# Altium integrated library Weidmueller_OMNIMATE_Signal.IntLib: 2550 symbols (part 35 of 45) (continued)
## 1876930000_Single (continued)

## 1876940000
designator J?
OMNIMATE Signal - series BL/SL 5.08; PartNumber: 1876940000; Manufacturer: Weidmueller; Short_text_for_material: SL-SMT 5.08/04/270FH 1.5SN BK RL; Side_termination_characteristic: Solder flange; Mounting_onto_the_PCB: Reflow solder connection; Pitch_mm: 5.08 mm; Pitch_inch: 0.2 inch; No_of_poles: 4; Outgoing_elbow: 270°; Solder_pin_length_mm: 1.5 mm; Contact_surface: tinned; Insulating_material: LCP GF; UL_94_flammability_rating: V-0; Rated_voltage_for_surge_voltage_class_pollution_degree_II_2: 400 V; Rated_current_min_no_of_poles_TU_20_deg_C: 19 A; Rated_voltage_use_group_B_UL_1059: 300 V; Rated_current_use_group_B_UL_1059: 15 A; PackageReference: SL_SMT_5_08_270FH_04; Colour: Black; Packaging: Tape; Qty: 335 PCS; Revision: V1; ComponentLink1Description: Manufacturer URL; ComponentLink1URL: http://www.weidmueller.com/; ComponentLink2Description: URL Link1; ComponentLink2URL: http://catalog.weidmueller.com/catalog/Start.do?localeId=en&ObjectID=1876940000
footprint SL_SMT_5_08_270FH_04 (OMNIMATE Signal - Serie BL/SL 5.08  SL-SMT 5.08/04/270)
pins: A1, A2, A3, A4

## 1876940000_Single
designator J?
OMNIMATE Signal - series BL/SL 5.08; PartNumber: 1876940000; Manufacturer: Weidmueller; Short_text_for_material: SL-SMT 5.08/04/270FH 1.5SN BK RL; Side_termination_characteristic: Solder flange; Mounting_onto_the_PCB: Reflow solder connection; Pitch_mm: 5.08 mm; Pitch_inch: 0.2 inch; No_of_poles: 4; Outgoing_elbow: 270°; Solder_pin_length_mm: 1.5 mm; Contact_surface: tinned; Insulating_material: LCP GF; UL_94_flammability_rating: V-0; Rated_voltage_for_surge_voltage_class_pollution_degree_II_2: 400 V; Rated_current_min_no_of_poles_TU_20_deg_C: 19 A; Rated_voltage_use_group_B_UL_1059: 300 V; Rated_current_use_group_B_UL_1059: 15 A; PackageReference: SL_SMT_5_08_270FH_04; Colour: Black; Packaging: Tape; Qty: 335 PCS; Revision: V1; ComponentLink1Description: Manufacturer URL; ComponentLink1URL: http://www.weidmueller.com/; ComponentLink2Description: URL Link1; ComponentLink2URL: http://catalog.weidmueller.com/catalog/Start.do?localeId=en&ObjectID=1876940000
footprint SL_SMT_5_08_270FH_04 (OMNIMATE Signal - Serie BL/SL 5.08  SL-SMT 5.08/04/270)
part A pins: A1
part B pins: A2
part C pins: A3
part D pins: A4

## 1876980000
designator J?
OMNIMATE Signal - series BL/SL 5.08; PartNumber: 1876980000; Manufacturer: Weidmueller; Short_text_for_material: SL-SMT 5.08/08/270FH 1.5SN BK RL; Side_termination_characteristic: Solder flange; Mounting_onto_the_PCB: Reflow solder connection; Pitch_mm: 5.08 mm; Pitch_inch: 0.2 inch; No_of_poles: 8; Outgoing_elbow: 270°; Solder_pin_length_mm: 1.5 mm; Contact_surface: tinned; Insulating_material: LCP GF; UL_94_flammability_rating: V-0; Rated_voltage_for_surge_voltage_class_pollution_degree_II_2: 400 V; Rated_current_min_no_of_poles_TU_20_deg_C: 19 A; Rated_voltage_use_group_B_UL_1059: 300 V; Rated_current_use_group_B_UL_1059: 15 A; PackageReference: SL_SMT_5_08_270FH_08; Colour: Black; Packaging: Tape; Qty: 285 PCS; Revision: V1; ComponentLink1Description: Manufacturer URL; ComponentLink1URL: http://www.weidmueller.com/; ComponentLink2Description: URL Link1; ComponentLink2URL: http://catalog.weidmueller.com/catalog/Start.do?localeId=en&ObjectID=1876980000
footprint SL_SMT_5_08_270FH_08 (OMNIMATE Signal - Serie BL/SL 5.08  SL-SMT 5.08/08/270)
pins: A1, A2, A3, A4, A5, A6, A7, A8

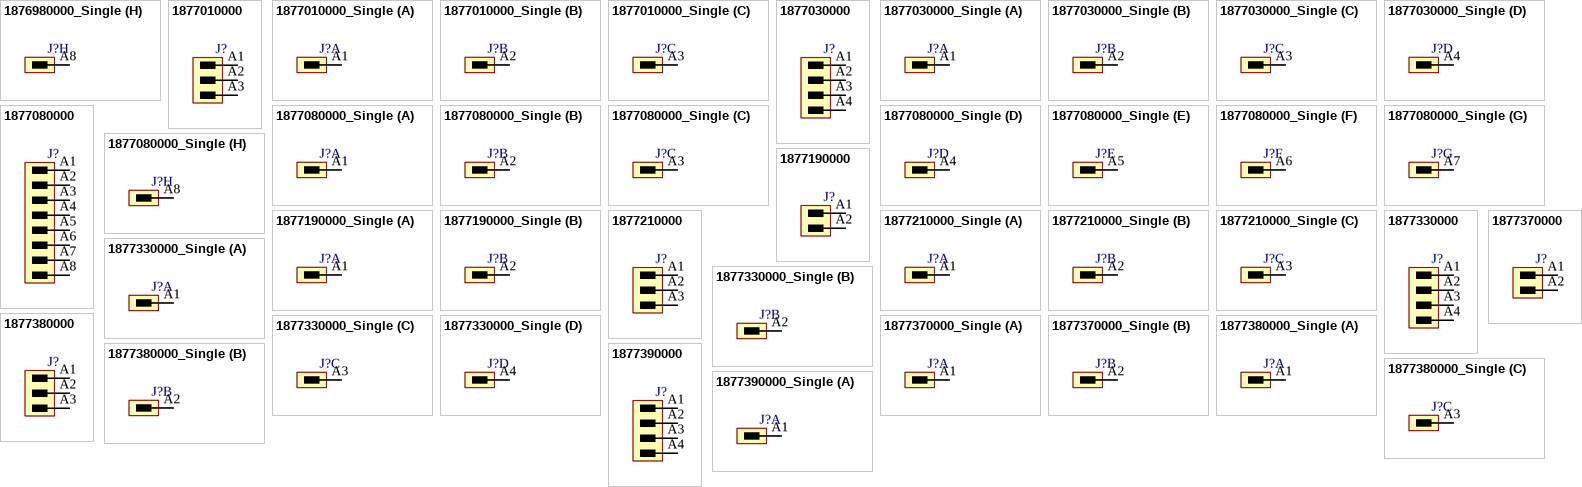
[diagram p167: symbols 1876980000_Single to 1877390000_Single]

## 1876980000_Single
designator J?
OMNIMATE Signal - series BL/SL 5.08; PartNumber: 1876980000; Manufacturer: Weidmueller; Short_text_for_material: SL-SMT 5.08/08/270FH 1.5SN BK RL; Side_termination_characteristic: Solder flange; Mounting_onto_the_PCB: Reflow solder connection; Pitch_mm: 5.08 mm; Pitch_inch: 0.2 inch; No_of_poles: 8; Outgoing_elbow: 270°; Solder_pin_length_mm: 1.5 mm; Contact_surface: tinned; Insulating_material: LCP GF; UL_94_flammability_rating: V-0; Rated_voltage_for_surge_voltage_class_pollution_degree_II_2: 400 V; Rated_current_min_no_of_poles_TU_20_deg_C: 19 A; Rated_voltage_use_group_B_UL_1059: 300 V; Rated_current_use_group_B_UL_1059: 15 A; PackageReference: SL_SMT_5_08_270FH_08; Colour: Black; Packaging: Tape; Qty: 285 PCS; Revision: V1; ComponentLink1Description: Manufacturer URL; ComponentLink1URL: http://www.weidmueller.com/; ComponentLink2Description: URL Link1; ComponentLink2URL: http://catalog.weidmueller.com/catalog/Start.do?localeId=en&ObjectID=1876980000
footprint SL_SMT_5_08_270FH_08 (OMNIMATE Signal - Serie BL/SL 5.08  SL-SMT 5.08/08/270)
part A pins: A1
part B pins: A2
part C pins: A3
part D pins: A4
part E pins: A5
part F pins: A6
part G pins: A7
part H pins: A8

## 1877010000
designator J?
OMNIMATE Signal - series BL/SL 5.08; PartNumber: 1877010000; Manufacturer: Weidmueller; Short_text_for_material: SL-SMT 5.08/03/270GH 1.5SN BK BX; Side_termination_characteristic: closed side; Mounting_onto_the_PCB: Reflow solder connection; Pitch_mm: 5.08 mm; Pitch_inch: 0.2 inch; No_of_poles: 3; Outgoing_elbow: 270°; Solder_pin_length_mm: 1.5 mm; Contact_surface: tinned; Insulating_material: LCP GF; UL_94_flammability_rating: V-0; Rated_voltage_for_surge_voltage_class_pollution_degree_II_2: 400 V; Rated_current_min_no_of_poles_TU_20_deg_C: 19 A; Rated_voltage_use_group_B_UL_1059: 300 V; Rated_current_use_group_B_UL_1059: 15 A; PackageReference: SL_SMT_5_08_270GH_03; Colour: Black; Packaging: Box; Qty: 100 PCS; Revision: V1; ComponentLink1Description: Manufacturer URL; ComponentLink1URL: http://www.weidmueller.com/; ComponentLink2Description: URL Link1; ComponentLink2URL: http://catalog.weidmueller.com/catalog/Start.do?localeId=en&ObjectID=1877010000
footprint SL_SMT_5_08_270GH_03 (OMNIMATE Signal - Serie BL/SL 5.08  SL-SMT 5.08/03/270GH 3.2)
pins: A1, A2, A3

## 1877010000_Single
designator J?
OMNIMATE Signal - series BL/SL 5.08; PartNumber: 1877010000; Manufacturer: Weidmueller; Short_text_for_material: SL-SMT 5.08/03/270GH 1.5SN BK BX; Side_termination_characteristic: closed side; Mounting_onto_the_PCB: Reflow solder connection; Pitch_mm: 5.08 mm; Pitch_inch: 0.2 inch; No_of_poles: 3; Outgoing_elbow: 270°; Solder_pin_length_mm: 1.5 mm; Contact_surface: tinned; Insulating_material: LCP GF; UL_94_flammability_rating: V-0; Rated_voltage_for_surge_voltage_class_pollution_degree_II_2: 400 V; Rated_current_min_no_of_poles_TU_20_deg_C: 19 A; Rated_voltage_use_group_B_UL_1059: 300 V; Rated_current_use_group_B_UL_1059: 15 A; PackageReference: SL_SMT_5_08_270GH_03; Colour: Black; Packaging: Box; Qty: 100 PCS; Revision: V1; ComponentLink1Description: Manufacturer URL; ComponentLink1URL: http://www.weidmueller.com/; ComponentLink2Description: URL Link1; ComponentLink2URL: http://catalog.weidmueller.com/catalog/Start.do?localeId=en&ObjectID=1877010000
footprint SL_SMT_5_08_270GH_03 (OMNIMATE Signal - Serie BL/SL 5.08  SL-SMT 5.08/03/270GH 3.2)
part A pins: A1
part B pins: A2
part C pins: A3

## 1877030000
designator J?
OMNIMATE Signal - series BL/SL 5.08; PartNumber: 1877030000; Manufacturer: Weidmueller; Short_text_for_material: SL-SMT 5.08/04/270GH 1.5SN BK BX; Side_termination_characteristic: closed side; Mounting_onto_the_PCB: Reflow solder connection; Pitch_mm: 5.08 mm; Pitch_inch: 0.2 inch; No_of_poles: 4; Outgoing_elbow: 270°; Solder_pin_length_mm: 1.5 mm; Contact_surface: tinned; Insulating_material: LCP GF; UL_94_flammability_rating: V-0; Rated_voltage_for_surge_voltage_class_pollution_degree_II_2: 400 V; Rated_current_min_no_of_poles_TU_20_deg_C: 19 A; Rated_voltage_use_group_B_UL_1059: 300 V; Rated_current_use_group_B_UL_1059: 15 A; PackageReference: SL_SMT_5_08_270GH_04; Colour: Black; Packaging: Box; Qty: 100 PCS; Revision: V1; ComponentLink1Description: Manufacturer URL; ComponentLink1URL: http://www.weidmueller.com/; ComponentLink2Description: URL Link1; ComponentLink2URL: http://catalog.weidmueller.com/catalog/Start.do?localeId=en&ObjectID=1877030000
footprint SL_SMT_5_08_270GH_04 (OMNIMATE Signal - Serie BL/SL 5.08  SL-SMT 5.08/04/270GH 3.2)
pins: A1, A2, A3, A4

## 1877030000_Single
designator J?
OMNIMATE Signal - series BL/SL 5.08; PartNumber: 1877030000; Manufacturer: Weidmueller; Short_text_for_material: SL-SMT 5.08/04/270GH 1.5SN BK BX; Side_termination_characteristic: closed side; Mounting_onto_the_PCB: Reflow solder connection; Pitch_mm: 5.08 mm; Pitch_inch: 0.2 inch; No_of_poles: 4; Outgoing_elbow: 270°; Solder_pin_length_mm: 1.5 mm; Contact_surface: tinned; Insulating_material: LCP GF; UL_94_flammability_rating: V-0; Rated_voltage_for_surge_voltage_class_pollution_degree_II_2: 400 V; Rated_current_min_no_of_poles_TU_20_deg_C: 19 A; Rated_voltage_use_group_B_UL_1059: 300 V; Rated_current_use_group_B_UL_1059: 15 A; PackageReference: SL_SMT_5_08_270GH_04; Colour: Black; Packaging: Box; Qty: 100 PCS; Revision: V1; ComponentLink1Description: Manufacturer URL; ComponentLink1URL: http://www.weidmueller.com/; ComponentLink2Description: URL Link1; ComponentLink2URL: http://catalog.weidmueller.com/catalog/Start.do?localeId=en&ObjectID=1877030000
footprint SL_SMT_5_08_270GH_04 (OMNIMATE Signal - Serie BL/SL 5.08  SL-SMT 5.08/04/270GH 3.2)
part A pins: A1
part B pins: A2
part C pins: A3
part D pins: A4

## 1877080000
designator J?
OMNIMATE Signal - series BL/SL 5.08; PartNumber: 1877080000; Manufacturer: Weidmueller; Short_text_for_material: SL-SMT 5.08/08/270GH 1.5SN BK BX; Side_termination_characteristic: closed side; Mounting_onto_the_PCB: Reflow solder connection; Pitch_mm: 5.08 mm; Pitch_inch: 0.2 inch; No_of_poles: 8; Outgoing_elbow: 270°; Solder_pin_length_mm: 1.5 mm; Contact_surface: tinned; Insulating_material: LCP GF; UL_94_flammability_rating: V-0; Rated_voltage_for_surge_voltage_class_pollution_degree_II_2: 400 V; Rated_current_min_no_of_poles_TU_20_deg_C: 19 A; Rated_voltage_use_group_B_UL_1059: 300 V; Rated_current_use_group_B_UL_1059: 15 A; PackageReference: SL_SMT_5_08_270GH_08; Colour: Black; Packaging: Box; Qty: 50 PCS; Revision: V1; ComponentLink1Description: Manufacturer URL; ComponentLink1URL: http://www.weidmueller.com/; ComponentLink2Description: URL Link1; ComponentLink2URL: http://catalog.weidmueller.com/catalog/Start.do?localeId=en&ObjectID=1877080000
footprint SL_SMT_5_08_270GH_08 (OMNIMATE Signal - Serie BL/SL 5.08  SL-SMT 5.08/08/270GH 3.2)
pins: A1, A2, A3, A4, A5, A6, A7, A8

## 1877080000_Single
designator J?
OMNIMATE Signal - series BL/SL 5.08; PartNumber: 1877080000; Manufacturer: Weidmueller; Short_text_for_material: SL-SMT 5.08/08/270GH 1.5SN BK BX; Side_termination_characteristic: closed side; Mounting_onto_the_PCB: Reflow solder connection; Pitch_mm: 5.08 mm; Pitch_inch: 0.2 inch; No_of_poles: 8; Outgoing_elbow: 270°; Solder_pin_length_mm: 1.5 mm; Contact_surface: tinned; Insulating_material: LCP GF; UL_94_flammability_rating: V-0; Rated_voltage_for_surge_voltage_class_pollution_degree_II_2: 400 V; Rated_current_min_no_of_poles_TU_20_deg_C: 19 A; Rated_voltage_use_group_B_UL_1059: 300 V; Rated_current_use_group_B_UL_1059: 15 A; PackageReference: SL_SMT_5_08_270GH_08; Colour: Black; Packaging: Box; Qty: 50 PCS; Revision: V1; ComponentLink1Description: Manufacturer URL; ComponentLink1URL: http://www.weidmueller.com/; ComponentLink2Description: URL Link1; ComponentLink2URL: http://catalog.weidmueller.com/catalog/Start.do?localeId=en&ObjectID=1877080000
footprint SL_SMT_5_08_270GH_08 (OMNIMATE Signal - Serie BL/SL 5.08  SL-SMT 5.08/08/270GH 3.2)
part A pins: A1
part B pins: A2
part C pins: A3
part D pins: A4
part E pins: A5
part F pins: A6
part G pins: A7
part H pins: A8

## 1877190000
designator J?
OMNIMATE Signal - series BL/SL 5.08; PartNumber: 1877190000; Manufacturer: Weidmueller; Short_text_for_material: SL-SMT 5.08/02/270FH 3.2SN BK BX; Side_termination_characteristic: Solder flange; Mounting_onto_the_PCB: Reflow solder connection; Pitch_mm: 5.08 mm; Pitch_inch: 0.2 inch; No_of_poles: 2; Outgoing_elbow: 270°; Solder_pin_length_mm: 3.2 mm; Contact_material: CuSn; Contact_surface: tinned; Insulating_material: LCP GF; UL_94_flammability_rating: V-0; Rated_voltage_for_surge_voltage_class_pollution_degree_II_2: 400 V; Rated_current_min_no_of_poles_TU_20_deg_C: 19 A; Rated_voltage_use_group_B_UL_1059: 300 V; Rated_current_use_group_B_UL_1059: 15 A; PackageReference: SL_SMT_5_08_270FH_02; Colour: Black; Packaging: Box; Qty: 100 PCS; Revision: V1; ComponentLink1Description: Manufacturer URL; ComponentLink1URL: http://www.weidmueller.com/; ComponentLink2Description: URL Link1; ComponentLink2URL: http://catalog.weidmueller.com/catalog/Start.do?localeId=en&ObjectID=1877190000
footprint SL_SMT_5_08_270FH_02 (OMNIMATE Signal - Serie BL/SL 5.08  SL-SMT 5.08/02/270)
pins: A1, A2

## 1877190000_Single
designator J?
OMNIMATE Signal - series BL/SL 5.08; PartNumber: 1877190000; Manufacturer: Weidmueller; Short_text_for_material: SL-SMT 5.08/02/270FH 3.2SN BK BX; Side_termination_characteristic: Solder flange; Mounting_onto_the_PCB: Reflow solder connection; Pitch_mm: 5.08 mm; Pitch_inch: 0.2 inch; No_of_poles: 2; Outgoing_elbow: 270°; Solder_pin_length_mm: 3.2 mm; Contact_material: CuSn; Contact_surface: tinned; Insulating_material: LCP GF; UL_94_flammability_rating: V-0; Rated_voltage_for_surge_voltage_class_pollution_degree_II_2: 400 V; Rated_current_min_no_of_poles_TU_20_deg_C: 19 A; Rated_voltage_use_group_B_UL_1059: 300 V; Rated_current_use_group_B_UL_1059: 15 A; PackageReference: SL_SMT_5_08_270FH_02; Colour: Black; Packaging: Box; Qty: 100 PCS; Revision: V1; ComponentLink1Description: Manufacturer URL; ComponentLink1URL: http://www.weidmueller.com/; ComponentLink2Description: URL Link1; ComponentLink2URL: http://catalog.weidmueller.com/catalog/Start.do?localeId=en&ObjectID=1877190000
footprint SL_SMT_5_08_270FH_02 (OMNIMATE Signal - Serie BL/SL 5.08  SL-SMT 5.08/02/270)
part A pins: A1
part B pins: A2

## 1877210000
designator J?
OMNIMATE Signal - series BL/SL 5.08; PartNumber: 1877210000; Manufacturer: Weidmueller; Short_text_for_material: SL-SMT 5.08/03/270FH 3.2SN BK BX; Side_termination_characteristic: Solder flange; Mounting_onto_the_PCB: Reflow solder connection; Pitch_mm: 5.08 mm; Pitch_inch: 0.2 inch; No_of_poles: 3; Outgoing_elbow: 270°; Solder_pin_length_mm: 3.2 mm; Contact_material: CuSn; Contact_surface: tinned; Insulating_material: LCP GF; UL_94_flammability_rating: V-0; Rated_voltage_for_surge_voltage_class_pollution_degree_II_2: 400 V; Rated_current_min_no_of_poles_TU_20_deg_C: 19 A; Rated_voltage_use_group_B_UL_1059: 300 V; Rated_current_use_group_B_UL_1059: 15 A; PackageReference: SL_SMT_5_08_270FH_03; Colour: Black; Packaging: Box; Qty: 100 PCS; Revision: V1; ComponentLink1Description: Manufacturer URL; ComponentLink1URL: http://www.weidmueller.com/; ComponentLink2Description: URL Link1; ComponentLink2URL: http://catalog.weidmueller.com/catalog/Start.do?localeId=en&ObjectID=1877210000
footprint SL_SMT_5_08_270FH_03 (OMNIMATE Signal - Serie BL/SL 5.08  SL-SMT 5.08/03/270)
pins: A1, A2, A3

## 1877210000_Single
designator J?
OMNIMATE Signal - series BL/SL 5.08; PartNumber: 1877210000; Manufacturer: Weidmueller; Short_text_for_material: SL-SMT 5.08/03/270FH 3.2SN BK BX; Side_termination_characteristic: Solder flange; Mounting_onto_the_PCB: Reflow solder connection; Pitch_mm: 5.08 mm; Pitch_inch: 0.2 inch; No_of_poles: 3; Outgoing_elbow: 270°; Solder_pin_length_mm: 3.2 mm; Contact_material: CuSn; Contact_surface: tinned; Insulating_material: LCP GF; UL_94_flammability_rating: V-0; Rated_voltage_for_surge_voltage_class_pollution_degree_II_2: 400 V; Rated_current_min_no_of_poles_TU_20_deg_C: 19 A; Rated_voltage_use_group_B_UL_1059: 300 V; Rated_current_use_group_B_UL_1059: 15 A; PackageReference: SL_SMT_5_08_270FH_03; Colour: Black; Packaging: Box; Qty: 100 PCS; Revision: V1; ComponentLink1Description: Manufacturer URL; ComponentLink1URL: http://www.weidmueller.com/; ComponentLink2Description: URL Link1; ComponentLink2URL: http://catalog.weidmueller.com/catalog/Start.do?localeId=en&ObjectID=1877210000
footprint SL_SMT_5_08_270FH_03 (OMNIMATE Signal - Serie BL/SL 5.08  SL-SMT 5.08/03/270)
part A pins: A1
part B pins: A2
part C pins: A3

## 1877330000
designator J?
OMNIMATE Signal - series BL/SL 5.08; PartNumber: 1877330000; Manufacturer: Weidmueller; Short_text_for_material: SL-SMT 5.08/04/270FH 3.2SN BK BX; Side_termination_characteristic: Solder flange; Mounting_onto_the_PCB: Reflow solder connection; Pitch_mm: 5.08 mm; Pitch_inch: 0.2 inch; No_of_poles: 4; Outgoing_elbow: 270°; Solder_pin_length_mm: 3.2 mm; Contact_material: CuSn; Contact_surface: tinned; Insulating_material: LCP GF; UL_94_flammability_rating: V-0; Rated_voltage_for_surge_voltage_class_pollution_degree_II_2: 400 V; Rated_current_min_no_of_poles_TU_20_deg_C: 19 A; Rated_voltage_use_group_B_UL_1059: 300 V; Rated_current_use_group_B_UL_1059: 15 A; PackageReference: SL_SMT_5_08_270FH_04; Colour: Black; Packaging: Box; Qty: 100 PCS; Revision: V1; ComponentLink1Description: Manufacturer URL; ComponentLink1URL: http://www.weidmueller.com/; ComponentLink2Description: URL Link1; ComponentLink2URL: http://catalog.weidmueller.com/catalog/Start.do?localeId=en&ObjectID=1877330000
footprint SL_SMT_5_08_270FH_04 (OMNIMATE Signal - Serie BL/SL 5.08  SL-SMT 5.08/04/270)
pins: A1, A2, A3, A4

## 1877330000_Single
designator J?
OMNIMATE Signal - series BL/SL 5.08; PartNumber: 1877330000; Manufacturer: Weidmueller; Short_text_for_material: SL-SMT 5.08/04/270FH 3.2SN BK BX; Side_termination_characteristic: Solder flange; Mounting_onto_the_PCB: Reflow solder connection; Pitch_mm: 5.08 mm; Pitch_inch: 0.2 inch; No_of_poles: 4; Outgoing_elbow: 270°; Solder_pin_length_mm: 3.2 mm; Contact_material: CuSn; Contact_surface: tinned; Insulating_material: LCP GF; UL_94_flammability_rating: V-0; Rated_voltage_for_surge_voltage_class_pollution_degree_II_2: 400 V; Rated_current_min_no_of_poles_TU_20_deg_C: 19 A; Rated_voltage_use_group_B_UL_1059: 300 V; Rated_current_use_group_B_UL_1059: 15 A; PackageReference: SL_SMT_5_08_270FH_04; Colour: Black; Packaging: Box; Qty: 100 PCS; Revision: V1; ComponentLink1Description: Manufacturer URL; ComponentLink1URL: http://www.weidmueller.com/; ComponentLink2Description: URL Link1; ComponentLink2URL: http://catalog.weidmueller.com/catalog/Start.do?localeId=en&ObjectID=1877330000
footprint SL_SMT_5_08_270FH_04 (OMNIMATE Signal - Serie BL/SL 5.08  SL-SMT 5.08/04/270)
part A pins: A1
part B pins: A2
part C pins: A3
part D pins: A4

## 1877370000
designator J?
OMNIMATE Signal - series BL/SL 5.08; PartNumber: 1877370000; Manufacturer: Weidmueller; Short_text_for_material: SL-SMT 5.08/02/270GH 3.2SN BK BX; Side_termination_characteristic: closed side; Mounting_onto_the_PCB: Reflow solder connection; Pitch_mm: 5.08 mm; Pitch_inch: 0.2 inch; No_of_poles: 2; Outgoing_elbow: 270°; Solder_pin_length_mm: 3.2 mm; Contact_material: CuSn; Contact_surface: tinned; Insulating_material: LCP GF; UL_94_flammability_rating: V-0; Rated_voltage_for_surge_voltage_class_pollution_degree_II_2: 400 V; Rated_current_min_no_of_poles_TU_20_deg_C: 19 A; Rated_voltage_use_group_B_UL_1059: 300 V; Rated_current_use_group_B_UL_1059: 15 A; PackageReference: SL_SMT_5_08_270GH_02; Colour: Black; Packaging: Box; Qty: 100 PCS; Revision: V1; ComponentLink1Description: Manufacturer URL; ComponentLink1URL: http://www.weidmueller.com/; ComponentLink2Description: URL Link1; ComponentLink2URL: http://catalog.weidmueller.com/catalog/Start.do?localeId=en&ObjectID=1877370000
footprint SL_SMT_5_08_270GH_02 (OMNIMATE Signal - Serie BL/SL 5.08  SL-SMT 5.08/02/270GH 3.2)
pins: A1, A2

## 1877370000_Single
designator J?
OMNIMATE Signal - series BL/SL 5.08; PartNumber: 1877370000; Manufacturer: Weidmueller; Short_text_for_material: SL-SMT 5.08/02/270GH 3.2SN BK BX; Side_termination_characteristic: closed side; Mounting_onto_the_PCB: Reflow solder connection; Pitch_mm: 5.08 mm; Pitch_inch: 0.2 inch; No_of_poles: 2; Outgoing_elbow: 270°; Solder_pin_length_mm: 3.2 mm; Contact_material: CuSn; Contact_surface: tinned; Insulating_material: LCP GF; UL_94_flammability_rating: V-0; Rated_voltage_for_surge_voltage_class_pollution_degree_II_2: 400 V; Rated_current_min_no_of_poles_TU_20_deg_C: 19 A; Rated_voltage_use_group_B_UL_1059: 300 V; Rated_current_use_group_B_UL_1059: 15 A; PackageReference: SL_SMT_5_08_270GH_02; Colour: Black; Packaging: Box; Qty: 100 PCS; Revision: V1; ComponentLink1Description: Manufacturer URL; ComponentLink1URL: http://www.weidmueller.com/; ComponentLink2Description: URL Link1; ComponentLink2URL: http://catalog.weidmueller.com/catalog/Start.do?localeId=en&ObjectID=1877370000
footprint SL_SMT_5_08_270GH_02 (OMNIMATE Signal - Serie BL/SL 5.08  SL-SMT 5.08/02/270GH 3.2)
part A pins: A1
part B pins: A2

## 1877380000
designator J?
OMNIMATE Signal - series BL/SL 5.08; PartNumber: 1877380000; Manufacturer: Weidmueller; Short_text_for_material: SL-SMT 5.08/03/270GH 3.2SN BK BX; Side_termination_characteristic: closed side; Mounting_onto_the_PCB: Reflow solder connection; Pitch_mm: 5.08 mm; Pitch_inch: 0.2 inch; No_of_poles: 3; Outgoing_elbow: 270°; Solder_pin_length_mm: 3.2 mm; Contact_material: CuSn; Contact_surface: tinned; Insulating_material: LCP GF; UL_94_flammability_rating: V-0; Rated_voltage_for_surge_voltage_class_pollution_degree_II_2: 400 V; Rated_current_min_no_of_poles_TU_20_deg_C: 19 A; Rated_voltage_use_group_B_UL_1059: 300 V; Rated_current_use_group_B_UL_1059: 15 A; PackageReference: SL_SMT_5_08_270GH_03; Colour: Black; Packaging: Box; Qty: 100 PCS; Revision: V1; ComponentLink1Description: Manufacturer URL; ComponentLink1URL: http://www.weidmueller.com/; ComponentLink2Description: URL Link1; ComponentLink2URL: http://catalog.weidmueller.com/catalog/Start.do?localeId=en&ObjectID=1877380000
footprint SL_SMT_5_08_270GH_03 (OMNIMATE Signal - Serie BL/SL 5.08  SL-SMT 5.08/03/270GH 3.2)
pins: A1, A2, A3

## 1877380000_Single
designator J?
OMNIMATE Signal - series BL/SL 5.08; PartNumber: 1877380000; Manufacturer: Weidmueller; Short_text_for_material: SL-SMT 5.08/03/270GH 3.2SN BK BX; Side_termination_characteristic: closed side; Mounting_onto_the_PCB: Reflow solder connection; Pitch_mm: 5.08 mm; Pitch_inch: 0.2 inch; No_of_poles: 3; Outgoing_elbow: 270°; Solder_pin_length_mm: 3.2 mm; Contact_material: CuSn; Contact_surface: tinned; Insulating_material: LCP GF; UL_94_flammability_rating: V-0; Rated_voltage_for_surge_voltage_class_pollution_degree_II_2: 400 V; Rated_current_min_no_of_poles_TU_20_deg_C: 19 A; Rated_voltage_use_group_B_UL_1059: 300 V; Rated_current_use_group_B_UL_1059: 15 A; PackageReference: SL_SMT_5_08_270GH_03; Colour: Black; Packaging: Box; Qty: 100 PCS; Revision: V1; ComponentLink1Description: Manufacturer URL; ComponentLink1URL: http://www.weidmueller.com/; ComponentLink2Description: URL Link1; ComponentLink2URL: http://catalog.weidmueller.com/catalog/Start.do?localeId=en&ObjectID=1877380000
footprint SL_SMT_5_08_270GH_03 (OMNIMATE Signal - Serie BL/SL 5.08  SL-SMT 5.08/03/270GH 3.2)
part A pins: A1
part B pins: A2
part C pins: A3

## 1877390000
designator J?
OMNIMATE Signal - series BL/SL 5.08; PartNumber: 1877390000; Manufacturer: Weidmueller; Short_text_for_material: SL-SMT 5.08/04/270GH 3.2SN BK BX; Side_termination_characteristic: closed side; Mounting_onto_the_PCB: Reflow solder connection; Pitch_mm: 5.08 mm; Pitch_inch: 0.2 inch; No_of_poles: 4; Outgoing_elbow: 270°; Solder_pin_length_mm: 3.2 mm; Contact_material: CuSn; Contact_surface: tinned; Insulating_material: LCP GF; UL_94_flammability_rating: V-0; Rated_voltage_for_surge_voltage_class_pollution_degree_II_2: 400 V; Rated_current_min_no_of_poles_TU_20_deg_C: 19 A; Rated_voltage_use_group_B_UL_1059: 300 V; Rated_current_use_group_B_UL_1059: 15 A; PackageReference: SL_SMT_5_08_270GH_04; Colour: Black; Packaging: Box; Qty: 100 PCS; Revision: V1; ComponentLink1Description: Manufacturer URL; ComponentLink1URL: http://www.weidmueller.com/; ComponentLink2Description: URL Link1; ComponentLink2URL: http://catalog.weidmueller.com/catalog/Start.do?localeId=en&ObjectID=1877390000
footprint SL_SMT_5_08_270GH_04 (OMNIMATE Signal - Serie BL/SL 5.08  SL-SMT 5.08/04/270GH 3.2)
pins: A1, A2, A3, A4

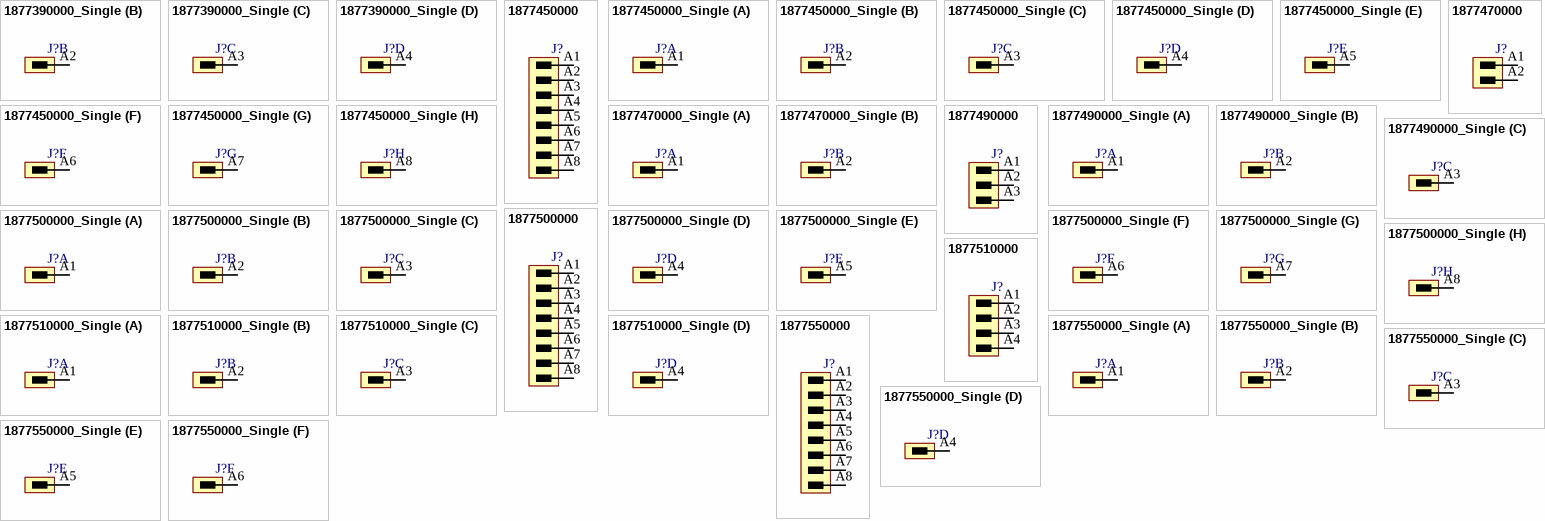
[diagram p168: symbols 1877390000_Single to 1877550000_Single]

## 1877390000_Single
designator J?
OMNIMATE Signal - series BL/SL 5.08; PartNumber: 1877390000; Manufacturer: Weidmueller; Short_text_for_material: SL-SMT 5.08/04/270GH 3.2SN BK BX; Side_termination_characteristic: closed side; Mounting_onto_the_PCB: Reflow solder connection; Pitch_mm: 5.08 mm; Pitch_inch: 0.2 inch; No_of_poles: 4; Outgoing_elbow: 270°; Solder_pin_length_mm: 3.2 mm; Contact_material: CuSn; Contact_surface: tinned; Insulating_material: LCP GF; UL_94_flammability_rating: V-0; Rated_voltage_for_surge_voltage_class_pollution_degree_II_2: 400 V; Rated_current_min_no_of_poles_TU_20_deg_C: 19 A; Rated_voltage_use_group_B_UL_1059: 300 V; Rated_current_use_group_B_UL_1059: 15 A; PackageReference: SL_SMT_5_08_270GH_04; Colour: Black; Packaging: Box; Qty: 100 PCS; Revision: V1; ComponentLink1Description: Manufacturer URL; ComponentLink1URL: http://www.weidmueller.com/; ComponentLink2Description: URL Link1; ComponentLink2URL: http://catalog.weidmueller.com/catalog/Start.do?localeId=en&ObjectID=1877390000
footprint SL_SMT_5_08_270GH_04 (OMNIMATE Signal - Serie BL/SL 5.08  SL-SMT 5.08/04/270GH 3.2)
part A pins: A1
part B pins: A2
part C pins: A3
part D pins: A4

## 1877450000
designator J?
OMNIMATE Signal - series BL/SL 5.08; PartNumber: 1877450000; Manufacturer: Weidmueller; Short_text_for_material: SL-SMT 5.08/08/270GH 3.2SN BK BX; Side_termination_characteristic: closed side; Mounting_onto_the_PCB: Reflow solder connection; Pitch_mm: 5.08 mm; Pitch_inch: 0.2 inch; No_of_poles: 8; Outgoing_elbow: 270°; Solder_pin_length_mm: 3.2 mm; Contact_material: CuSn; Contact_surface: tinned; Insulating_material: LCP GF; UL_94_flammability_rating: V-0; Rated_voltage_for_surge_voltage_class_pollution_degree_II_2: 400 V; Rated_current_min_no_of_poles_TU_20_deg_C: 19 A; Rated_voltage_use_group_B_UL_1059: 300 V; Rated_current_use_group_B_UL_1059: 15 A; PackageReference: SL_SMT_5_08_270GH_08; Colour: Black; Packaging: Box; Qty: 50 PCS; Revision: V1; ComponentLink1Description: Manufacturer URL; ComponentLink1URL: http://www.weidmueller.com/; ComponentLink2Description: URL Link1; ComponentLink2URL: http://catalog.weidmueller.com/catalog/Start.do?localeId=en&ObjectID=1877450000
footprint SL_SMT_5_08_270GH_08 (OMNIMATE Signal - Serie BL/SL 5.08  SL-SMT 5.08/08/270GH 3.2)
pins: A1, A2, A3, A4, A5, A6, A7, A8

## 1877450000_Single
designator J?
OMNIMATE Signal - series BL/SL 5.08; PartNumber: 1877450000; Manufacturer: Weidmueller; Short_text_for_material: SL-SMT 5.08/08/270GH 3.2SN BK BX; Side_termination_characteristic: closed side; Mounting_onto_the_PCB: Reflow solder connection; Pitch_mm: 5.08 mm; Pitch_inch: 0.2 inch; No_of_poles: 8; Outgoing_elbow: 270°; Solder_pin_length_mm: 3.2 mm; Contact_material: CuSn; Contact_surface: tinned; Insulating_material: LCP GF; UL_94_flammability_rating: V-0; Rated_voltage_for_surge_voltage_class_pollution_degree_II_2: 400 V; Rated_current_min_no_of_poles_TU_20_deg_C: 19 A; Rated_voltage_use_group_B_UL_1059: 300 V; Rated_current_use_group_B_UL_1059: 15 A; PackageReference: SL_SMT_5_08_270GH_08; Colour: Black; Packaging: Box; Qty: 50 PCS; Revision: V1; ComponentLink1Description: Manufacturer URL; ComponentLink1URL: http://www.weidmueller.com/; ComponentLink2Description: URL Link1; ComponentLink2URL: http://catalog.weidmueller.com/catalog/Start.do?localeId=en&ObjectID=1877450000
footprint SL_SMT_5_08_270GH_08 (OMNIMATE Signal - Serie BL/SL 5.08  SL-SMT 5.08/08/270GH 3.2)
part A pins: A1
part B pins: A2
part C pins: A3
part D pins: A4
part E pins: A5
part F pins: A6
part G pins: A7
part H pins: A8

## 1877470000
designator J?
OMNIMATE Signal - series BL/SL 5.08; PartNumber: 1877470000; Manufacturer: Weidmueller; Short_text_for_material: SL-SMT 5.08/02/270GL 3.2SN BK BX; Side_termination_characteristic: closed side; Mounting_onto_the_PCB: Reflow solder connection; Pitch_mm: 5.08 mm; Pitch_inch: 0.2 inch; No_of_poles: 2; Outgoing_elbow: 270°; Solder_pin_length_mm: 3.2 mm; Contact_material: CuSn; Contact_surface: tinned; Insulating_material: LCP GF; UL_94_flammability_rating: V-0; Rated_voltage_for_surge_voltage_class_pollution_degree_II_2: 400 V; Rated_current_min_no_of_poles_TU_20_deg_C: 19 A; Rated_voltage_use_group_B_UL_1059: 300 V; Rated_current_use_group_B_UL_1059: 15 A; PackageReference: SL_SMT_5_08_270GL_02; Colour: Black; Packaging: Box; Qty: 100 PCS; Revision: V1; ComponentLink1Description: Manufacturer URL; ComponentLink1URL: http://www.weidmueller.com/; ComponentLink2Description: URL Link1; ComponentLink2URL: http://catalog.weidmueller.com/catalog/Start.do?localeId=en&ObjectID=1877470000
footprint SL_SMT_5_08_270GL_02 (OMNIMATE Signal - Serie BL/SL 5.08  SL-SMT 5.08/02/270GL 3.2)
pins: A1, A2

## 1877470000_Single
designator J?
OMNIMATE Signal - series BL/SL 5.08; PartNumber: 1877470000; Manufacturer: Weidmueller; Short_text_for_material: SL-SMT 5.08/02/270GL 3.2SN BK BX; Side_termination_characteristic: closed side; Mounting_onto_the_PCB: Reflow solder connection; Pitch_mm: 5.08 mm; Pitch_inch: 0.2 inch; No_of_poles: 2; Outgoing_elbow: 270°; Solder_pin_length_mm: 3.2 mm; Contact_material: CuSn; Contact_surface: tinned; Insulating_material: LCP GF; UL_94_flammability_rating: V-0; Rated_voltage_for_surge_voltage_class_pollution_degree_II_2: 400 V; Rated_current_min_no_of_poles_TU_20_deg_C: 19 A; Rated_voltage_use_group_B_UL_1059: 300 V; Rated_current_use_group_B_UL_1059: 15 A; PackageReference: SL_SMT_5_08_270GL_02; Colour: Black; Packaging: Box; Qty: 100 PCS; Revision: V1; ComponentLink1Description: Manufacturer URL; ComponentLink1URL: http://www.weidmueller.com/; ComponentLink2Description: URL Link1; ComponentLink2URL: http://catalog.weidmueller.com/catalog/Start.do?localeId=en&ObjectID=1877470000
footprint SL_SMT_5_08_270GL_02 (OMNIMATE Signal - Serie BL/SL 5.08  SL-SMT 5.08/02/270GL 3.2)
part A pins: A1
part B pins: A2

## 1877490000
designator J?
OMNIMATE Signal - series BL/SL 5.08; PartNumber: 1877490000; Manufacturer: Weidmueller; Short_text_for_material: SL-SMT 5.08/03/270GL 3.2SN BK BX; Side_termination_characteristic: closed side; Mounting_onto_the_PCB: Reflow solder connection; Pitch_mm: 5.08 mm; Pitch_inch: 0.2 inch; No_of_poles: 3; Outgoing_elbow: 270°; Solder_pin_length_mm: 3.2 mm; Contact_material: CuSn; Contact_surface: tinned; Insulating_material: LCP GF; UL_94_flammability_rating: V-0; Rated_voltage_for_surge_voltage_class_pollution_degree_II_2: 400 V; Rated_current_min_no_of_poles_TU_20_deg_C: 19 A; Rated_voltage_use_group_B_UL_1059: 300 V; Rated_current_use_group_B_UL_1059: 15 A; PackageReference: SL_SMT_5_08_270GL_03; Colour: Black; Packaging: Box; Qty: 100 PCS; Revision: V1; ComponentLink1Description: Manufacturer URL; ComponentLink1URL: http://www.weidmueller.com/; ComponentLink2Description: URL Link1; ComponentLink2URL: http://catalog.weidmueller.com/catalog/Start.do?localeId=en&ObjectID=1877490000
footprint SL_SMT_5_08_270GL_03 (OMNIMATE Signal - Serie BL/SL 5.08  SL-SMT 5.08/03/270GL 3.2)
pins: A1, A2, A3

## 1877490000_Single
designator J?
OMNIMATE Signal - series BL/SL 5.08; PartNumber: 1877490000; Manufacturer: Weidmueller; Short_text_for_material: SL-SMT 5.08/03/270GL 3.2SN BK BX; Side_termination_characteristic: closed side; Mounting_onto_the_PCB: Reflow solder connection; Pitch_mm: 5.08 mm; Pitch_inch: 0.2 inch; No_of_poles: 3; Outgoing_elbow: 270°; Solder_pin_length_mm: 3.2 mm; Contact_material: CuSn; Contact_surface: tinned; Insulating_material: LCP GF; UL_94_flammability_rating: V-0; Rated_voltage_for_surge_voltage_class_pollution_degree_II_2: 400 V; Rated_current_min_no_of_poles_TU_20_deg_C: 19 A; Rated_voltage_use_group_B_UL_1059: 300 V; Rated_current_use_group_B_UL_1059: 15 A; PackageReference: SL_SMT_5_08_270GL_03; Colour: Black; Packaging: Box; Qty: 100 PCS; Revision: V1; ComponentLink1Description: Manufacturer URL; ComponentLink1URL: http://www.weidmueller.com/; ComponentLink2Description: URL Link1; ComponentLink2URL: http://catalog.weidmueller.com/catalog/Start.do?localeId=en&ObjectID=1877490000
footprint SL_SMT_5_08_270GL_03 (OMNIMATE Signal - Serie BL/SL 5.08  SL-SMT 5.08/03/270GL 3.2)
part A pins: A1
part B pins: A2
part C pins: A3

## 1877500000
designator J?
OMNIMATE Signal - series BL/SL 5.08; PartNumber: 1877500000; Manufacturer: Weidmueller; Short_text_for_material: SL-SMT 5.08/08/270FH 3.2SN BK BX; Side_termination_characteristic: Solder flange; Mounting_onto_the_PCB: Reflow solder connection; Pitch_mm: 5.08 mm; Pitch_inch: 0.2 inch; No_of_poles: 8; Outgoing_elbow: 270°; Solder_pin_length_mm: 3.2 mm; Contact_material: CuSn; Contact_surface: tinned; Insulating_material: LCP GF; UL_94_flammability_rating: V-0; Rated_voltage_for_surge_voltage_class_pollution_degree_II_2: 400 V; Rated_current_min_no_of_poles_TU_20_deg_C: 19 A; Rated_voltage_use_group_B_UL_1059: 300 V; Rated_current_use_group_B_UL_1059: 15 A; PackageReference: SL_SMT_5_08_270FH_08; Colour: Black; Packaging: Box; Qty: 50 PCS; Revision: V1; ComponentLink1Description: Manufacturer URL; ComponentLink1URL: http://www.weidmueller.com/; ComponentLink2Description: URL Link1; ComponentLink2URL: http://catalog.weidmueller.com/catalog/Start.do?localeId=en&ObjectID=1877500000
footprint SL_SMT_5_08_270FH_08 (OMNIMATE Signal - Serie BL/SL 5.08  SL-SMT 5.08/08/270)
pins: A1, A2, A3, A4, A5, A6, A7, A8

## 1877500000_Single
designator J?
OMNIMATE Signal - series BL/SL 5.08; PartNumber: 1877500000; Manufacturer: Weidmueller; Short_text_for_material: SL-SMT 5.08/08/270FH 3.2SN BK BX; Side_termination_characteristic: Solder flange; Mounting_onto_the_PCB: Reflow solder connection; Pitch_mm: 5.08 mm; Pitch_inch: 0.2 inch; No_of_poles: 8; Outgoing_elbow: 270°; Solder_pin_length_mm: 3.2 mm; Contact_material: CuSn; Contact_surface: tinned; Insulating_material: LCP GF; UL_94_flammability_rating: V-0; Rated_voltage_for_surge_voltage_class_pollution_degree_II_2: 400 V; Rated_current_min_no_of_poles_TU_20_deg_C: 19 A; Rated_voltage_use_group_B_UL_1059: 300 V; Rated_current_use_group_B_UL_1059: 15 A; PackageReference: SL_SMT_5_08_270FH_08; Colour: Black; Packaging: Box; Qty: 50 PCS; Revision: V1; ComponentLink1Description: Manufacturer URL; ComponentLink1URL: http://www.weidmueller.com/; ComponentLink2Description: URL Link1; ComponentLink2URL: http://catalog.weidmueller.com/catalog/Start.do?localeId=en&ObjectID=1877500000
footprint SL_SMT_5_08_270FH_08 (OMNIMATE Signal - Serie BL/SL 5.08  SL-SMT 5.08/08/270)
part A pins: A1
part B pins: A2
part C pins: A3
part D pins: A4
part E pins: A5
part F pins: A6
part G pins: A7
part H pins: A8

## 1877510000
designator J?
OMNIMATE Signal - series BL/SL 5.08; PartNumber: 1877510000; Manufacturer: Weidmueller; Short_text_for_material: SL-SMT 5.08/04/270GL 3.2SN BK BX; Side_termination_characteristic: closed side; Mounting_onto_the_PCB: Reflow solder connection; Pitch_mm: 5.08 mm; Pitch_inch: 0.2 inch; No_of_poles: 4; Outgoing_elbow: 270°; Solder_pin_length_mm: 3.2 mm; Contact_material: CuSn; Contact_surface: tinned; Insulating_material: LCP GF; UL_94_flammability_rating: V-0; Rated_voltage_for_surge_voltage_class_pollution_degree_II_2: 400 V; Rated_current_min_no_of_poles_TU_20_deg_C: 19 A; Rated_voltage_use_group_B_UL_1059: 300 V; Rated_current_use_group_B_UL_1059: 15 A; PackageReference: SL_SMT_5_08_270GL_04; Colour: Black; Packaging: Box; Qty: 100 PCS; Revision: V1; ComponentLink1Description: Manufacturer URL; ComponentLink1URL: http://www.weidmueller.com/; ComponentLink2Description: URL Link1; ComponentLink2URL: http://catalog.weidmueller.com/catalog/Start.do?localeId=en&ObjectID=1877510000
footprint SL_SMT_5_08_270GL_04 (OMNIMATE Signal - Serie BL/SL 5.08  SL-SMT 5.08/04/270GL 3.2)
pins: A1, A2, A3, A4